# Altium footprint library Misc.PCBLIB: 128 footprints (part 1 of 8)
Each footprint in its own frame and in the unit in brackets; x right, y up, seen from the top. Pads: shape width x height; smd on the part's side, far side on the other; paste and mask are expansions set on the pad; w line width, h text height; cw(c..) or ccw(c..) is an arc to the next point about the centre after c.
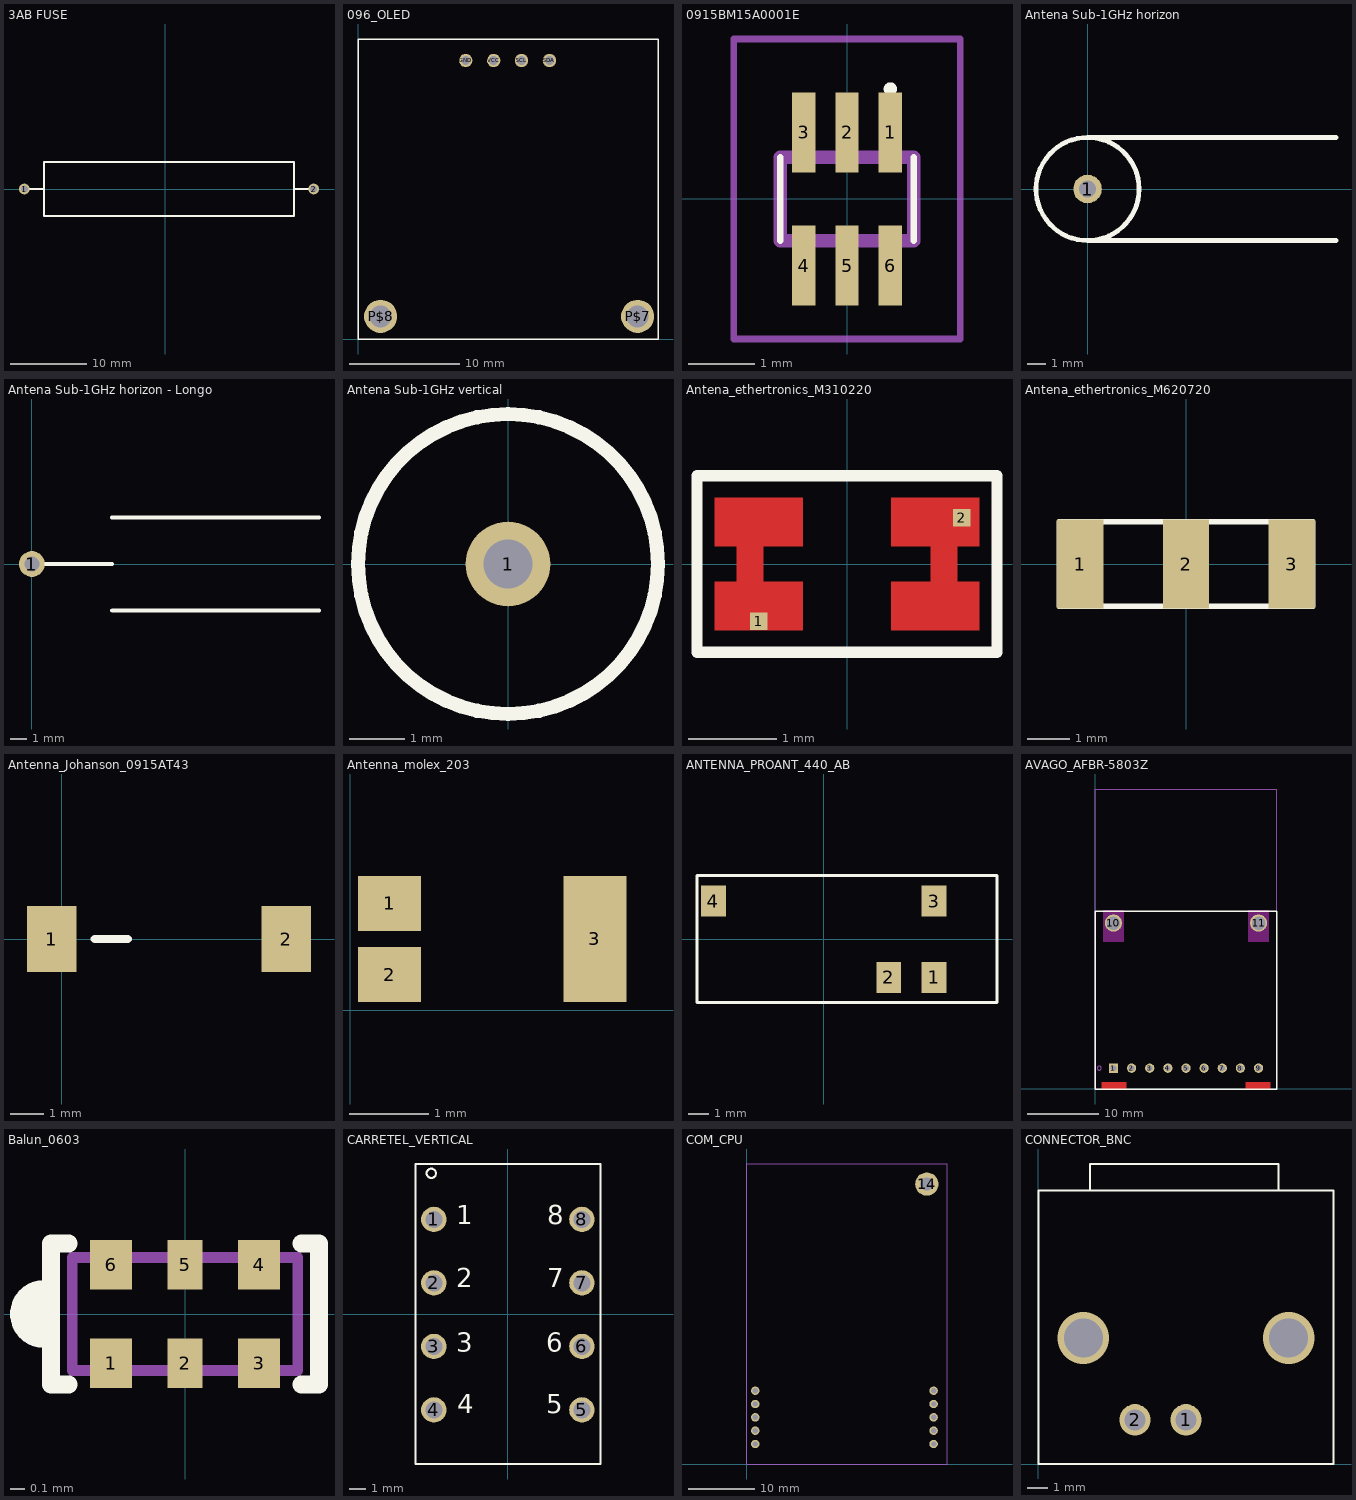
[diagram p0: the footprints below, top view; thin cyan lines are the x and y axes]

## 3AB FUSE [mm]
pads (2):
  round 1.4 hole 0.9: 1(-18.39,0.01) 2(19.41,0.01)
Top Overlay:
  lines w0.254: -18.39,0.01 -15.85,0.01 ; 16.87,0.01 19.41,0.01 ; -15.85,-3.49 16.87,-3.49 16.87,3.51 -15.85,3.51 -15.85,-3.49

## 096_OLED [mil]
pads (6):
  round 48 hole 32: GND(386,998) SCL(586,998) SDA(686,998) VCC(486,998)
  round 118.5 hole 79: P$7(1002,81) P$8(81,81)
Top Overlay:
  lines w5: 0,0 0,1075 1075,1075 1075,0 0,0

## 0915BM15A0001E [mm]
pads (6):
  rect 0.35x1.2 smd: 1(0.65,1) 2(0,1) 3(-0.65,1) 4(-0.65,-1) 5(0,-1) 6(0.65,-1)
Top Overlay:
  lines w0.1: -1,-0.625 -1,0.625 ; 1,-0.625 1,0.625 ; 0.65,1.6 cw(c0.65,1.65) 0.65,1.7 cw(c0.65,1.65) 0.65,1.6
Mechanical 15:
  lines w0.2: -1,-0.625 1,-0.625 1,0.625 -1,0.625 -1,-0.625
Mechanical 20:
  lines w0.1: -1.7,-2.1 1.7,-2.1 1.7,2.4 -1.7,2.4 -1.7,-2.1
3D body "0915BM15A0001E.stp": height 0.9, standoff 0, extent -1,-1.365 1,1.365

## Antena Sub-1GHz horizon [mil]
pads (1):
  round 60 hole 35: 1(0,0)
Top Overlay:
  circle w10: c0,0 r108.27
  lines w10: 0,-108.27 521.65,-108.27 ; 0,108.27 521.65,108.27
3D body "coil_antenna_horizon.step": height 263.33, standoff 0, extent -17.16,-127.03 512.17,124.06

## Antena Sub-1GHz horizon - Longo [mil]
pads (1):
  round 60 hole 35: 1(0,0)
Top Overlay:
  lines w10: 0,0 187.01,0 ; 187.01,108.27 669.29,108.27 ; 187.2,-108.27 669.29,-108.27
3D body "coil_antenna_horizon_long.step": height 241.1, standoff -4.88, extent -17.16,-124.12 684.61,121.87

## Antena Sub-1GHz vertical [mil]
pads (1):
  round 60 hole 35: 1(0,0)
Top Overlay:
  circle w10: c0,0 r106.3
3D body "coil_antenna.step": height 527.52, standoff 19.72, extent -125.52,-125.53 125.6,125.54

## Antena_ethertronics_M310220 [mm] "Antena chip Ethertronics BT e wifi"
pads (2):
  rect 0.2x0.2 smd: 1(-1,-0.65) 2(1.3,0.525)
Top Layer:
  region: 1.5,0.75 0.5,0.75 0.5,0.2 0.95,0.2 0.95,-0.2 0.5,-0.2 0.5,-0.75 1.5,-0.75 1.5,-0.2 1.25,-0.2 1.25,0.2 1.5,0.2
  region: -1.5,-0.75 -0.5,-0.75 -0.5,-0.2 -0.95,-0.2 -0.95,0.2 -0.5,0.2 -0.5,0.75 -1.5,0.75 -1.5,0.2 -1.25,0.2 -1.25,-0.2 -1.5,-0.2
Top Overlay:
  lines w0.127: -1.7,-1 0,-1 1.7,-1 1.7,1 -1.7,1 -1.7,-1
3D body: height 1.08, standoff 0, extent -1.5,-0.75 1.5,0.75

## Antena_ethertronics_M620720 [mm] "Antena chip Ethertronics Sub-1GHz"
pads (3):
  rect 1.1x2.1 smd: 1(-2.5,0) 2(0,0) 3(2.5,0)
Top Overlay:
  lines w0.127: -3,-1 -3,1 3,1 3,-1 -3,-1
3D body: height 1.08, standoff 0, extent -2.99,-1 3,1

## Antenna_Johanson_0915AT43 [mm] "Antennas 915MHz ANTENNA"
pads (2):
  rect 1.5x2 smd: 1(-0.3,0) 2(6.8,0)
Top Overlay:
  lines w0.254: 1,0 2,0
3D body "0915AT43A0026E.stp": height 0.9, standoff 0, extent -0.75,-1.01 7.25,0.99

## Antenna_molex_203 [mm] "Wi-Fi-ready MID Chip  and Ceramic SMT Antennas"
pads (3):
  rect 0.8x0.7 smd: 1(0.5,1.35) 2(0.5,0.45)
  rect 0.8x1.6 smd: 3(3.1,0.9)
3D body "chip.step": height 1.1, standoff 0, extent 0.2,0.1 3.4,1.7

## ANTENNA_PROANT_440_AB [mm] "Small antenna for embedded products on the 2.4GHz ISM band, suitable for applications in  WLAN/Wifi, Bluetooth, Zigbee, RFID, WirelessHART etc."
pads (4):
  rect 1.2x1.5 smd: 1(5.35,-1.85) 2(3.15,-1.85) 3(5.35,1.85) 4(-5.35,1.85)
Top Overlay:
  lines w0.15: -6.15,-3.075 -6.15,3.1 8.4,3.1 8.4,-3.075 -6.15,-3.075
3D body: height 3.6, standoff 0, extent -5.75,-2.675 8,2.7

## AVAGO_AFBR-5803Z [mm]
pads (11):
  rect 1.3x1.3 / inner round 1.3 / far side rect 1.3x1.3 hole 0.8: 1(2.525,2.9)
  round 1.3 hole 0.8: 2(5.065,2.9) 3(7.605,2.9)
  round 1.3 hole 0.8 paste+0: 4(10.145,2.9) 5(12.685,2.9) 6(15.225,2.9) 7(17.765,2.9) 8(20.305,2.9) 9(22.845,2.9)
  round 2.4 hole 1.9: 10(2.525,23.22) 11(22.845,23.22)
Top Layer:
  region: 21.035,0.895 21.035,0.025 24.46,0.025 24.46,0.895
  region: 0.91,0.895 0.91,0.025 4.335,0.025 4.335,0.895
Top Overlay:
  lines w0.178: -0.015,-0.02 25.385,-0.02 25.385,24.9 -0.015,24.9 -0.015,-0.02
Keep-Out Layer:
  rectangle: 1.025,20.58 4.025,25.08
  rectangle: 21.345,20.58 24.345,25.08
Mechanical 4:
  circle w0.127: c0.525,2.9 r0.279
  lines w0.127: -0.015,-0.02 -0.015,42 25.385,42 25.385,-0.02 -0.015,-0.02
3D body "User Library-AFBR-5803ATZ.step": height 12.5, standoff -4.1, extent 0,0 25.4,42

## Balun_0603 [mm] "SMD Balun 0603"
height 0.6
pads (6):
  rect 0.3x0.35 smd: 1(-0.525,-0.35) 3(0.525,-0.35) 4(0.525,0.35) 6(-0.525,0.35)
  rect 0.25x0.35 smd: 2(0,-0.35) 5(0,0.35)
Top Overlay:
  lines w0.127: -1,-0.178 cw(c-1,0) -1,0.178 ; -0.975,-0.089 cw(c-0.975,0) -0.975,0.089 ; -0.825,-0.5 -0.95,-0.5 -0.95,0.5 -0.825,0.5 ; 0.825,-0.5 0.95,-0.5 0.95,0.5 0.825,0.5
Mechanical 1:
  lines w0.076: -0.8,-0.4 0.8,-0.4 0.8,0.4 -0.8,0.4 -0.8,-0.4
3D body: height 0.6, standoff 0, extent -0.8,-0.4 0.8,0.4

## CARRETEL_VERTICAL [mil]
pads (8):
  round 60 hole 40: 1(-175.2,224) 2(-175.2,74) 3(-175.2,-76.38) 4(-175.2,-226.38) 5(175,-226.38) 6(175,-76.38) 7(175,74) 8(175,224)
Top Overlay:
  circle w5: c-181.1,333 r11
  lines w5: -218.5,-354.33 219,-354.33 219,355 -218.5,355 -218.5,-354.33
  text "8" at 93,197 h77.5
  text "7" at 93,48 h77.5
  text "6" at 91,-104.33 h77.5
  text "5" at 91,-250 h77.5
  text "4" at -120.08,-250 h77.5
  text "3" at -122.05,-104.33 h77.5
  text "2" at -122.05,48 h77.5
  text "1" at -122.05,197 h77.5
3D body: height 761.02, standoff 0, extent -220,-355 220,355

## COM_CPU [mm]
pads (11):
  round 3.5 hole 2: 14(27,42)
  round 1.27 hole 0.813: P$1(1.25,3) P$2(1.25,5) P$3(1.25,7) P$4(1.25,9) P$5(1.25,11) P$6(28,3) P$7(28,5) P$8(28,7) P$9(28,9) P$10(28,11)
Mechanical 4:
  lines w0.127: 0,0 0,45.009 30.023,45.009 30.023,0 0,0
3D body "CPU_MT7688.step": height 9.1, standoff 0.25, extent 0,0 30,45

## CONNECTOR_BNC [mil]
pads (2):
  round 60 hole 40: 1(281.5,84.25) 2(184.25,84.25)
via 85.83,240.16 diameter 98.43 hole 74.8
via 477.17,240.16 diameter 98.43 hole 74.8
Top Overlay:
  lines w3.94: 98.03,521.65 98.03,572.05 458.27,572.05 458.27,521.65 ; 0,0 0,521.65 562.99,521.65 562.99,0 0,0
3D body "c-227161-1-af-3d.stp": height 622.65, standoff -164.35, extent -3.15,-48.82 577.85,1351.18